# Altium footprint library MyPcbLib.PcbLib: 657 footprints (part 5 of 42)
Each footprint in its own frame and in the unit in brackets; x right, y up, seen from the top. Pads: shape width x height; smd on the part's side, far side on the other; paste and mask are expansions set on the pad; w line width, h text height; cw(c..) or ccw(c..) is an arc to the next point about the centre after c.
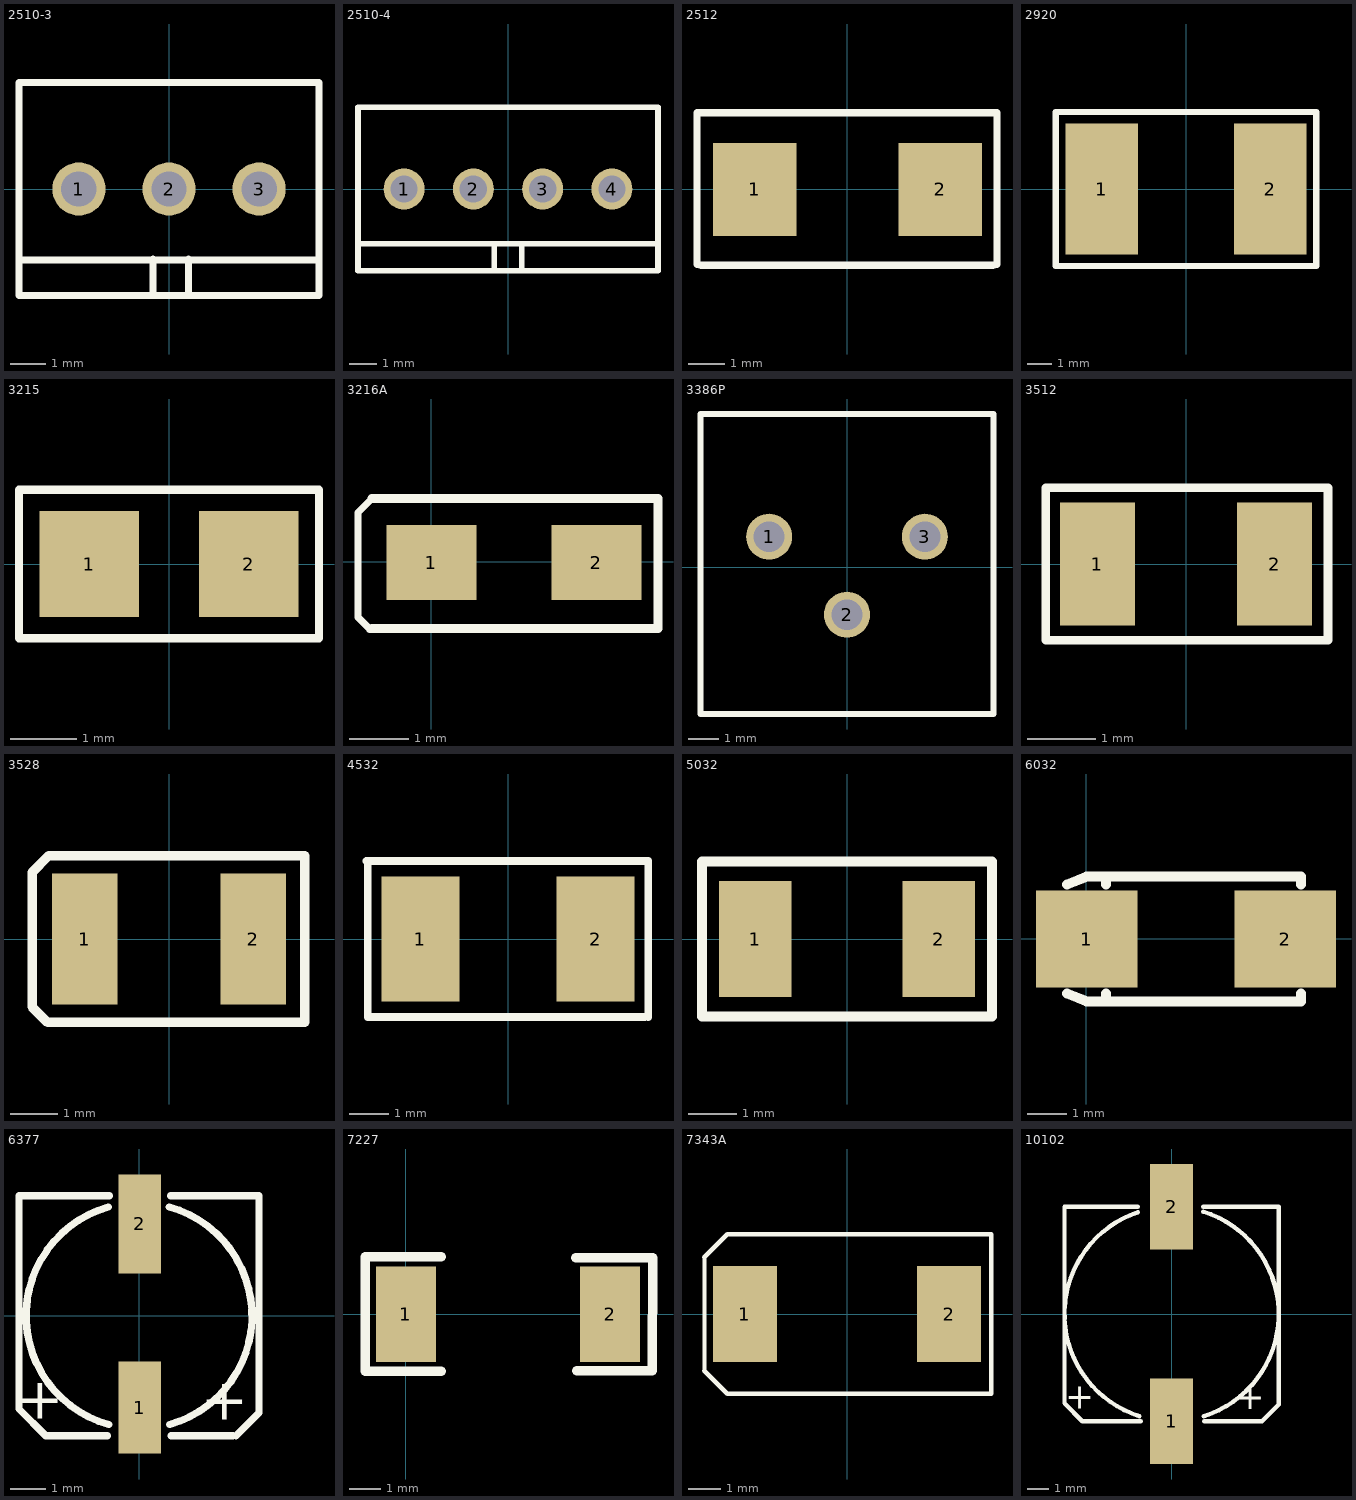
[diagram p4: the footprints below, top view; thin cyan lines are the x and y axes]

## 2510-3 [mm]
pads (3):
  round 1.5 hole 1: 1(-2.54,0) 2(0,0) 3(2.54,0)
Top Overlay:
  lines w0.203: -4.23,-2 4.191,-2 ; -0.449,-2.93 -0.449,-1.981 ; 0.551,-2.981 0.551,-1.981 ; 4.191,-3 -4.23,-3 -4.23,3 4.23,3 4.23,-3

## 2510-4 [mm]
pads (4):
  round 1.5 hole 1: 1(-3.81,0) 2(-1.27,0) 3(1.27,0) 4(3.81,0)
Top Overlay:
  lines w0.203: -5.5,-2 5.449,-2 ; -0.5,-2.949 -0.5,-2 ; 0.5,-3 0.5,-2 ; -5.5,-3 5.5,-3 5.5,3 -5.5,3 -5.5,-3
3D body: height 11.7, standoff -2, extent -5,-3 5.16,2.8

## 2512 [mil]
pads (2):
  rect 90x100 smd: 1(-100,0) 2(100,0)
Top Overlay:
  lines w8: -162,-80.56 -157.43,-81.5 156.36,-81.5 161,-80.52 161,82.5 -162,82.5 -162,-80.56

## 2920 [mm]
pads (2):
  rect 3x5.44 smd: 1(-3.5,0) 2(3.5,0)
Top Overlay:
  lines w0.254: -5.4,-3.2 5.4,-3.2 ; -5.4,-3.175 -5.4,3.2 5.4,3.2 5.4,-3.175

## 3215 [mm]
pads (2):
  rect 1.5x1.6 smd: 1(-1.2,0) 2(1.2,0)
Top Overlay:
  lines w0.127: -2.261,-1.118 -2.261,1.118 2.261,1.118 2.261,-1.118 -2.261,-1.118

## 3216A [mil]
pads (2):
  rect 60x50 smd: 1(-0.03,-0.38) 2(109.97,-0.38)
Top Overlay:
  lines w5: -40,42 -49,33 -49,-37 -41,-45 -39,-45
  lines w5.91: -39.86,-44.29 151.09,-44.29 151.09,42.32 -39.86,42.32
3D body: height 65, standoff 0.04, extent -11.74,-32 121.74,30.99

## 3386P [mm]
pads (3):
  round 1.5 hole 1: 1(-2.54,1) 2(0,-1.54) 3(2.54,1)
Top Overlay:
  lines w0.203: -4.78,-4.78 4.78,-4.78 4.78,5 -4.78,5 -4.78,-4.78

## 3512 [mm]
pads (2):
  rect 1.1x1.8 smd: 1(-1.3,0) 2(1.3,0)
Top Overlay:
  lines w0.127: -2.057,-1.118 -2.057,1.118 2.083,1.118 2.083,-1.118 -2.057,-1.118

## 3528 [mm]
pads (2):
  rect 1.4x2.8 smd: 1(-1.8,0) 2(1.8,0)
Top Overlay:
  lines w0.203: -2.921,-1.448 -2.921,1.422 -2.565,1.778 2.896,1.778 2.896,-1.778 -2.591,-1.778 -2.921,-1.448
3D body: height -0.4, standoff -2.3, extent -1.671,-1.425 1.829,1.375

## 4532 [mm]
pads (2):
  rect 2x3.2 smd: 1(-2.25,0) 2(2.25,0)
Top Overlay:
  lines w0.203: -3.632,2.007 3.581,2.007 ; -3.6,-2 -3.6,2 ; -3.581,-2.007 3.505,-2.007 ; 3.6,-2 3.6,2

## 5032 [mm]
pads (2):
  rect 1.5x2.4 smd: 1(-1.9,0) 2(1.9,0)
Top Overlay:
  lines w0.203: -3,-1.6 -3,1.6 ; -2.997,1.6 2.997,1.6 ; -2.972,-1.6 2.997,-1.6 ; 3,-1.6 3,1.6

## 6032 [mm]
pads (2):
  rect 2.6x2.5 smd: 1(0.005,-0.01) 2(5.105,-0.01)
Top Overlay:
  lines w0.254: -0.495,-1.41 0.005,-1.61 5.505,-1.61 5.505,-1.41 ; -0.495,1.39 0.005,1.59 5.505,1.59 5.505,1.39 ; 0.505,-1.61 0.505,-1.41 ; 0.505,1.39 0.505,1.59

## 6377 [mm] "16V"
pads (2):
  rect 1.2x2.6 smd: 1(0.025,-2.6)
  rect 1.2x2.8 smd: 2(0.025,2.6)
Top Overlay:
  lines w0.203: -0.889,-3.4 -2.645,-3.4 -3.4,-2.645 -3.4,3.4 -0.838,3.4 ; -0.866,3.08 ccw(c0,0) -0.855,-3.084 ; 0.855,3.084 cw(c0,0) 0.866,-3.08 ; 0.889,3.4 3.378,3.4 ; 0.911,-3.4 2.667,-3.4 ; 2.747,-3.4 3.4,-2.747 3.4,3.4
  text "+" at 3.099,-3.327 h2
  text "+" at -2.134,-3.302 h2

## 7227 [mil]
pads (2):
  rect 75x120 smd: 1(0,0) 2(255.73,0)
Top Overlay:
  lines w12: 44,-71.27 -51,-71.27 -51,71.73 44,71.73 ; 213,70.73 308,70.73 ; 213.73,-71 308.73,-71 309,70.73

## 7343A [mm]
pads (2):
  rect 2x3 smd: 1(-3.2,0) 2(3.2,0)
Top Overlay:
  lines w0.127: -4.47,-1.778 -4.47,1.778
  lines w0.15: -4.47,-1.778 -3.748,-2.5 4.521,-2.5 4.521,2.5 -3.748,2.5 -4.47,1.778

## 10102 [mm] "1000uF/16V,220uF/50V"
pads (2):
  rect 2x4 smd: 1(0,-5) 2(0,5)
Top Overlay:
  lines w0.203: -1.575,5 -5,5 -5,-4.169 -4.169,-5 -1.448,-5 ; -1.566,4.748 ccw(c0,0) -1.498,-4.77 ; 1.473,5 5,5 5,-4.22 4.22,-5 1.524,-5 ; 1.476,4.777 cw(c0,0) 1.497,-4.771
  text "+" at -3.607,-4.826 h2
  text "+" at 4.343,-4.851 h2